# Altium integrated library LED-THP_V2.IntLib: 218 symbols (continued)
## LED-Clear-3mm-Diffused
designator LD?  value Clear-DF  Text1: 3mm  (hidden comment: LED-Clear-3mm-Diffused)
LED Clear 3mm - Diffused; Manufacturer: Various; Part Number: LED Clear 3mm - Diffused; Package: LED-3mm-Clear; EDM-PN: *; SAAB PN: *
footprint LED-3mm-Clear (LED 3mm 4.0x4.0mm Clear)
pins: 1 K, 2 A

## LED-Clear-3mm-Rt
designator LD?  value Clear  Text1: 3mm  (hidden comment: LED-Clear-3mm-Rt)
LED Clear 3mm Rt Angle; Manufacturer: Various; Part Number: LED Clear 3mm; Package: LED-3mm-Clear-Rt; EDM-PN: *; SAAB PN: *
footprint LED-3mm-Clear-Rt (LED 3mm R Angle 4.0x4.0mm Clear)
pins: 1 K, 2 A

## LED-Clear-5mm
designator LD?  value Clear  Text1: 5mm  (hidden comment: LED-Clear-5mm)
LED Clear 5mm; Manufacturer: Various; Part Number: LED Clear 5mm; Package: LED-5mm-Clear; EDM-PN: *; SAAB PN: *
footprint LED-5mm-Clear (LED 5mm 5.9x5.5mm)
pins: 1 K, 2 A

## LED-Clear-5mm-Diffused
designator LD?  value Clear-DF  Text1: 5mm  (hidden comment: LED-Clear-5mm-Diffused)
LED Clear 5mm - Diffused; Manufacturer: Various; Part Number: LED Clear 5mm - Diffused; Package: LED-5mm-Clear; EDM-PN: *; SAAB PN: *
footprint LED-5mm-Clear (LED 5mm 5.9x5.5mm)
pins: 1 K, 2 A

## LED-Clear-5mm-FLAT
designator LD?, comment value Clear  Text1: 5mm  (hidden comment: LED-Clear-5mm)
LED Clear 5mm (Mounted Flat); Manufacturer: Various; Part Number: LED Clear 5mm; Package: LED-5mm-Clear-FLAT; EDM-PN: *; SAAB PN: *
footprint LED-5mm-Clear-Flat (LED 5mm 5.9x5.5mm)
pins: 1 K, 2 A

## LED-Green-3mm
designator LD?  value Green  Text1: 3mm  (hidden comment: LED-Green-3mm)
LED Green 3mm; Manufacturer: Various; EDM-PN: LED21; Reutech PN: 5961-LE-0024; Part Number: LED Green 3mm; Package: LED-3mm-Green; SAAB PN: *
footprint LED-3mm-Green (LED 3mm 4.0x4.0mm Green)
pins: 1 K, 2 A

## LED-Green-3mm-4mm
designator LD?, comment value Green  Text1: 3mm  (hidden comment: LED-Green-3mm)
LED Green 3mm - 4mm Space; Manufacturer: Various; EDM-PN: LED21; Reutech PN: 5961-LE-0024; Part Number: LED Green 3mm; Package: LED-3mm-Green-4; SAAB PN: *
footprint LED-3mm-Green-4mm (LED 3mm 4.0x4.0mm Green)
pins: 1 K, 2 A

## LED-Green-3mm-9mm
designator LD?  value Green  Text1: 3mm  (hidden comment: LED-Green-3mm-9mm)
LED Green 3mm; Manufacturer: Various; EDM-PN: LED21; Reutech PN: 5961-LE-0024; Part Number: LED Green 3mm; Package: LED-3mm-Green-9mm; SAAB PN: *
footprint LED-3mm-Green-9MM (LED 3mm 4.0x4.0mm Green)
pins: 1 K, 2 A

## LED-Green-3mm-22mm
designator LD?  value Green  Text1: 3mm  (hidden comment: LED-Green-3mm-22mm)
LED Green 3mm (22mm High); Manufacturer: Various; EDM-PN: LED21; Part Number: LED Green 3mm; Package: LED-3mm-Green-22mm; SAAB PN: *
footprint LED-3mm-Green-22mm (LED 3mm 4.0x4.0mm Green)
pins: 1 K, 2 A

## LED-Green-3mm-7376
designator LD?  value Green  Text1: 3mm  (hidden comment: LED-Green-3mm-7376)
LED Green 3mm and Spacer; Manufacturer: Various/Keystone; Part Number: LED Green 3mm/7376; EDM-PN: LED21; Package: LED-3mm-Green-7376; Reutech PN: *; SAAB PN: *
footprint LED-3mm-Green-7376 (LED 3mm 4.0x4.0mm Green)
pins: 1 K, 2 A

## LED-Green-3mm-151031VS04000
designator LD?, comment value Green  Text1: 3mm  (hidden comment: 151031VS04000)
LED Green 3mm - Diffused; Manufacturer: Wurth; Part Number: 151031VS04000; Package: LED-3mm-Green; EDM-PN: *; Reutech PN: *; SAAB PN: *
footprint LED-3mm-Green (LED 3mm 4.0x4.0mm Green)
pins: 1 K, 2 A

## LED-Green-3mm-Diffused
designator LD?  value Green-DF  Text1: 3mm  (hidden comment: LED-Green-3mm-Diffused)
LED Green 3mm - Diffused; Manufacturer: Various; Part Number: LED Green 3mm - Diffused; Package: LED-3mm-Green; EDM-PN: *; SAAB PN: *
footprint LED-3mm-Green (LED 3mm 4.0x4.0mm Green)
pins: 1 K, 2 A

## LED-Green-3mm-HLMP-1521
designator LD?, comment value Green  Text1: 3mm  (hidden comment: HLMP-1521)
LED Green 3mm 10mA; Manufacturer: Broadcom; Part Number: HLMP-1521; Package: LED-3mm-Green; EDM-PN: *; Reutech PN: *; SAAB PN: *
footprint LED-3mm-Green (LED 3mm 4.0x4.0mm Green)
pins: 1 K, 2 A

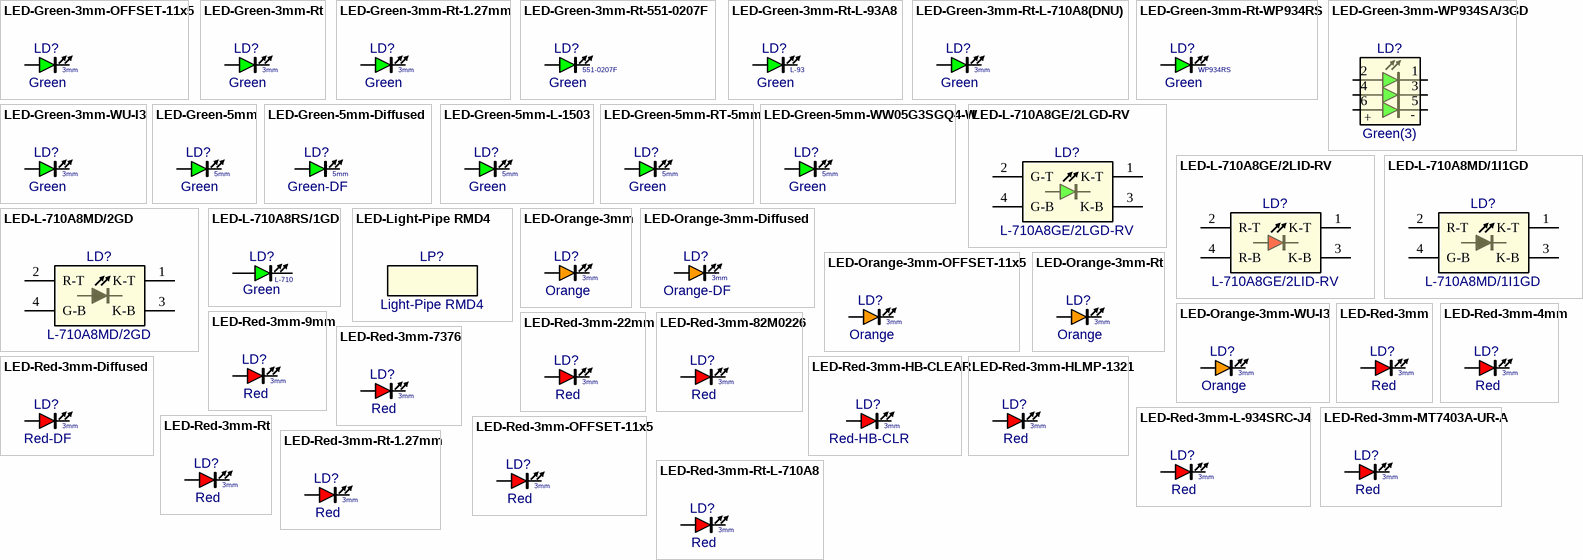
[diagram p3: symbols LED-Green-3mm-OFFSET-11x5 to LED-Red-3mm-Rt-L-710A8]

## LED-Green-3mm-OFFSET-11x5
designator LD?, comment value Green  Text1: 3mm  (hidden comment: LED-Green-3mm)
LED Green 3mm; Manufacturer: Various; Reutech PN: 5961-LE-0024; Part Number: LED Green 3mm; Package: LED-3mm-Green-5MM-OFFSET; EDM-PN: *; SAAB PN: *
footprint LED-3mm-Green-5MM-OFFSET (LED 3mm 4.0x4.0mm Green)
pins: 1 K, 2 A

## LED-Green-3mm-Rt
designator LD?  value Green  Text1: 3mm  (hidden comment: LED-Green-3mm-Rt)
LED Green 3mm Rt Angle; Manufacturer: Various; EDM-PN: LED21; Reutech PN: 5961-LE-0024; Part Number: LED Green 3mm; Package: LED-3mm-Green-Rt; SAAB PN: *
footprint LED-3mm-Green-Rt (LED 3mm R Angle 4.0x4.0mm Green)
pins: 1 K, 2 A

## LED-Green-3mm-Rt-1.27mm
designator LD?  value Green  Text1: 3mm  (hidden comment: LED-Green-3mm-Rt-1.27mm)
LED Green 3mm Rt Angle; Manufacturer: Various; EDM-PN: LED21; Part Number: LED Green 3mm; Package: LED-3mm-Green-Rt-1.27mm; Reutech PN: *; SAAB PN: *
footprint LED-3mm-Green-Rt-1.27mm (LED 3mm Rt Angle 4.0x4.0mm Green)
pins: 1 K, 2 A

## LED-Green-3mm-Rt-551-0207F
designator LD?, comment value Green  (hidden comment: 551-0207F)
LED Green 3mm Rt Angle; Manufacturer: Dialight; EDM-PN: LED79; Part Number: 551-0207F; Package: LED-3mm-L-93A8-Green; SAAB PN: *; Text1: 551-0207F
footprint LED-3mm-Green-551-0207F (LED-3mm-L551-0207F-Green 6.35x4.6mm)
pins: 1 K, 2 A

## LED-Green-3mm-Rt-L-93A8
designator LD?  value Green  Text1: L-93  (hidden comment: LED-Green-3mm-Rt-L-93A8)
LED Green 3mm Rt Angle; Manufacturer: Kingbright; Part Number: L-93A8CB/1GD; Package: LED-3mm-L-93A8-Green; EDM-PN: *; SAAB PN: *
footprint LED-3mm-L-93A8-Green (LED-3mm-L-93A8-Green 6.35x4.6mm)
pins: 1 K, 2 A

## LED-Green-3mm-Rt-L-710A8(DNU)
designator LD?, comment value Green  Text1: 3mm  (hidden comment: LED-Green-3mm-Rt-L-710A8)
LED Green 3mm Rt Angle; Manufacturer: Kingbright; Part Number: L-710A8RS/1GD; Package: LED-3mm-L-710-Green; EDM-PN: *; SAAB PN: *
footprint LED-3mm-L-710-Green (LED-3mm-L-710-Green 6.35x4.32mm)
pins: 1 K, 2 A

## LED-Green-3mm-Rt-WP934RS
designator LD?  value Green  Text1: WP934RS  (hidden comment: LED-Green-3mm-Rt-WP934RS)
LED Green 3mm Rt Angle; Manufacturer: Kingbright; Part Number: WP934RS/GD; Package: LED-3mm-WP934RS-Green; EDM-PN: *; SAAB PN: *
footprint LED-3mm-L-934RS-Green (LED-3mm-L-934RS-Green 4.6x4.6mm)
pins: 1 K, 2 A

## LED-Green-3mm-WP934SA/3GD
designator LD?  value Green(3)  (hidden comment: LED-Green-3mm-WP934SA/3GD)
LED Green 3mm tri-Level; Manufacturer: Kingbright; Part Number: WP934SA/3GD; Package: LED-3mm-Green; EDM-PN: *; Text1: *; SAAB PN: *
footprint T-1(3mm)TRI-LEVEL-Green (T-1(3mm)TRI-LEVEL  Green 11.43x4.32mm)
pins: 1 K1, 2 A1, 3 K2, 4 A2, 5 K3, 6 A3
text: +; -

## LED-Green-3mm-WU-I3
designator LD?  value Green  Text1: 3mm  (hidden comment: LED-Green-3mm-WU-I3)
LED Green 3mm and WU-I3 Holder; Manufacturer: Various/Commuica; Part Number: LED Green 3mm/WU-I3; Package: LED-3mm-Green-WU-I3; EDM-PN: *; SAAB PN: *
footprint LED-3mm-GREEN-WU-I3 (LED 3mm WU-I3 8.0x8.0mm Green)
pins: 1 K, 2 A

## LED-Green-5mm
designator LD?  value Green  Text1: 5mm  (hidden comment: LED-Green-5mm)
LED Green 5mm; Manufacturer: Various; Part Number: LED Green 5mm; Package: LED-5mm-Green; EDM-PN: *; SAAB PN: *
footprint LED-5mm-Green (LED 5mm 5.9x5.5mm)
pins: 1 K, 2 A

## LED-Green-5mm-Diffused
designator LD?  value Green-DF  Text1: 5mm  (hidden comment: LED-Green-5mm-Diffused)
LED Green 5mm - Diffused; Manufacturer: Various; Part Number: LED Green 5mm - Diffused; Package: LED-5mm-Green; EDM-PN: *; SAAB PN: *
footprint LED-5mm-Green (LED 5mm 5.9x5.5mm)
pins: 1 K, 2 A

## LED-Green-5mm-L-1503
designator LD?, comment value Green  Text1: 5mm  (hidden comment: LED-Green-SB-5mm-L1503)
LED Green 5mm Rt Angle; Manufacturer: Kingbright; Part Number: L-1503CB/1GD; Package: LED-5MM-GREEN-RT-9.2x6; EDM-PN: *; SAAB PN: *
footprint LED-5MM-GREEN-RT-9.2x6 (LED-5mm RT 9.2x6.0mm Green)
pins: 1 K, 2 A

## LED-Green-5mm-RT-5mm
designator LD?, comment value Green  Text1: 5mm  (hidden comment: LED-Green-5mm)
LED Green 5mm; Manufacturer: Various; Part Number: LED Green 5mm; Package: LED-5mm-Green-RT-5mm; EDM-PN: *; SAAB PN: *
footprint LED-5mm-Green-RT-5mm (LED 5mm 5.9x5.5mm)
pins: 1 K, 2 A

## LED-Green-5mm-WW05G3SGQ4-W
designator LD?, comment value Green  Text1: 5mm  (hidden comment: WW05G3SGQ4-W)
LED Green 5mm 4.7mm High; Manufacturer: WAH WANG Holdings/Rabtron; EDM-PN: LED190; Part Number: WW05G3SGQ4-W; Package: LED-5x4.7mm-Green; SAAB PN: *
footprint LED-5x4.7mm-GREEN (LED 5mm 5.9x5.5mm 4.7mm Green)
pins: 1 K, 2 A

## LED-L-710A8GE/2LGD-RV
designator LD?, comment value L-710A8GE/2LGD-RV  (hidden comment: LED3mm-Dual-L-710A8GE/2LGD-RV)
LED Dual 3mm T-1 Rt Angle Green/Green; Manufacturer: Kingbright; Part Number: L-710A8GE/2LGD-RV; Package: LED-3mm-L-710-D-Green; EDM-PN: *; SAAB PN: *
footprint LED-3mm-L-710-D-Green (LED 3mm 10.54x4.3mm Dual Rt Angle)
pins: 1 K-T, 2 G-T, 3 K-B, 4 G-B

## LED-L-710A8GE/2LID-RV
designator LD?, comment value L-710A8GE/2LID-RV  (hidden comment: LED3mm-Dual-L-710A8GE/2LID-RV)
LED Dual 3mm T-1 Rt Angle Red/Red; Manufacturer: Kingbright; Part Number: L-710A8GE/2LID-RV; Package: LED-3mm-L-710-D-red; EDM-PN: *; SAAB PN: *
footprint LED-3mm-L-710-D-Red (LED 3mm 10.54x4.3mm Dual Rt Angle)
pins: 1 K-T, 2 R-T, 3 K-B, 4 R-B

## LED-L-710A8MD/1I1GD
designator LD?, comment value L-710A8MD/1I1GD  (hidden comment: LED3mm-Dual-L-710A8MD/1I1GD)
LED Dual 3mm T-1 Rt Angle Red/Green; Manufacturer: Kingbright; Part Number: L-710A8MD/1I1GD; Package: LED-3mm-Dual-Rt-R/G; EDM-PN: *; SAAB PN: *
footprint LED-3mm-Dual-Rt-R/G (LED 3mm 8.13x4.3mm Dual Rt Angle)
pins: 1 K-T, 2 R-T, 3 K-B, 4 G-B

## LED-L-710A8MD/2GD
designator LD?, comment L-710A8MD/2GD
LED Dual 3mm T-1 Rt Angle Green/Green; Manufacturer: Kingbright; Part Number: L-710A8MD/2GD; Package: LED-3mm-Dual-Rt-G/G; EDM-PN: *; SAAB PN: *; Value: L-710A8MD/2GD
footprint LED-3mm-Dual-Rt-G/G (LED 3mm 8.13x4.3mm Dual Rt Angle)
pins: 1 K-T, 2 R-T, 3 K-B, 4 G-B

## LED-L-710A8RS/1GD
designator LD?  value Green  Text1: L-710  (hidden comment: LED-L-710A8RS/1GD)
LED Green 3mm Rt Angle; Manufacturer: Kingbright; Package: LED-3mm-L-710-Green; EDM-PN: *; SAAB PN: *; Part Number: L-710A8RS/1GD
footprint LED-3mm-L-710-Green (LED-3mm-L-710-Green 6.35x4.32mm)
pins: 1 K, 2 G

## LED-Light-Pipe RMD4
designator LP?  value Light-Pipe RMD4  (hidden comment: LED-Light-Pipe RMD4)
LED Light Pipe; Manufacturer: Owner; Part Number: Light-Pipe RMD4; Package: Light-Pipe-RMD4; EDM-PN: *; SAAB PN: *
footprint Light-Pipe-RMD4

## LED-Orange-3mm
designator LD?  value Orange  Text1: 3mm  (hidden comment: LED-Orange-3mm)
LED Orange 3mm; Manufacturer: Various; Part Number: LED Orange 3mm; Package: LED-3mm-Orange; EDM-PN: *; SAAB PN: *
footprint LED-3mm-Orange (LED 3mm 4.0x4.0mm Orange)
pins: 1 K, 2 A

## LED-Orange-3mm-Diffused
designator LD?  value Orange-DF  Text1: 3mm  (hidden comment: LED-Orange-3mm-Diffused)
LED Orange 3mm - Diffused; Manufacturer: Various; Part Number: LED Orange 3mm - Diffused; Package: LED-3mm-Orange; EDM-PN: *; SAAB PN: *
footprint LED-3mm-Orange (LED 3mm 4.0x4.0mm Orange)
pins: 1 K, 2 A

## LED-Orange-3mm-OFFSET-11x5
designator LD?, comment value Orange  Text1: 3mm  (hidden comment: LED-Orange-3mm)
LED Orange 3mm; Manufacturer: Various; Part Number: LED Orange 3mm; Package: LED-3mm-Orange-5MM-OFFSET; EDM-PN: *; SAAB PN: *
footprint LED-3mm-ORANGE-5MM-OFFSET (LED 3mm 4.0x4.0mm ORANGE)
pins: 1 K, 2 A

## LED-Orange-3mm-Rt
designator LD?  value Orange  Text1: 3mm  (hidden comment: LED-Orange-3mm-Rt)
LED Orange 3mm Rt Angle; Manufacturer: Various; Part Number: LED Orange 3mm; Package: LED-3mm-Orange-Rt; EDM-PN: *; SAAB PN: *
footprint LED-3mm-Orange-Rt (LED 3mm R Angle 4.0x4.0mm Orange)
pins: 1 K, 2 A

## LED-Orange-3mm-WU-I3
designator LD?  value Orange  Text1: 3mm  (hidden comment: LED-Orange-3mm-WU-I3)
LED Orange 3mm and WU-I3 Holder; Manufacturer: Various/Commuica; Part Number: LED Orange 3mm/WU-I3; Package: LED-3mm-Orange-WU-I3; EDM-PN: *; SAAB PN: *
footprint LED-3mm-ORANGE-WU-I3 (LED 3mm WU-I3 8.0x8.0mm Orange)
pins: 1 K, 2 A

## LED-Red-3mm
designator LD?  value Red  Text1: 3mm  (hidden comment: LED-Red-3mm)
LED Red 3mm; Manufacturer: Various; EDM-PN: LED94; Reutech PN: 5961-LE-0073; Part Number: LED Red 3mm; Package: LED-3mm-Red; SAAB PN: *
footprint LED-3mm-Red (LED 3mm 4.0x4.0mm Red)
pins: 1 K, 2 A

## LED-Red-3mm-4mm
designator LD?, comment value Red  Text1: 3mm  (hidden comment: LED-Red-3mm)
LED Red 3mm - 4mm Space; Manufacturer: Various; EDM-PN: LED94; Reutech PN: 5961-LE-0073; Part Number: LED Red 3mm; Package: LED-3mm-Red-4mm; SAAB PN: *
footprint LED-3mm-Red-4mm (LED 3mm 4.0x4.0mm Red)
pins: 1 K, 2 A

## LED-Red-3mm-9mm
designator LD?  value Red  Text1: 3mm  (hidden comment: LED-Red-3mm-9mm)
LED Red 3mm; Manufacturer: Various; EDM-PN: LED94; Reutech PN: 5961-LE-0073; Part Number: LED Red 3mm; Package: LED-3mm-Red-9mm; SAAB PN: *
footprint LED-3mm-Red-9MM (LED 3mm 4.0x4.0mm Red)
pins: 1 K, 2 A

## LED-Red-3mm-22mm
designator LD?  value Red  Text1: 3mm  (hidden comment: LED-Red-3mm-22mm)
LED Red 3mm (22mm High); Manufacturer: Various; EDM-PN: LED94; Part Number: LED Red 3mm; Package: LED-3mm-Red-22mm; SAAB PN: *
footprint LED-3mm-Red-22mm (LED 3mm 4.0x4.0mm Red)
pins: 1 K, 2 A

## LED-Red-3mm-82M0226
designator LD?  value Red  Text1: 3mm  (hidden comment: LED-Red-3mm-82M0226)
LED Red 3mm and 82M0226; Manufacturer: Various/Mantech; Part Number: LED Red 3mm/82M0226; Package: LED-3mm-Red-82M0226; EDM-PN: *; SAAB PN: *
footprint LED-3mm-Red (LED 3mm 4.0x4.0mm Red)
pins: 1 K, 2 A

## LED-Red-3mm-7376
designator LD?  value Red  Text1: 3mm  (hidden comment: LED-Red-3mm-7376)
LED Red 3mm and Spacer; Manufacturer: Various/Keystone; Part Number: LED Red 3mm/7376; Package: LED-3mm-Red-7376; EDM-PN: *; Reutech PN: *; SAAB PN: *
footprint LED-3mm-Red-7376 (LED 3mm 4.0x4.0mm Red)
pins: 1 K, 2 A

## LED-Red-3mm-Diffused
designator LD?  value Red-DF  Text1: 3mm  (hidden comment: LED-Red-3mm-Diffused)
LED Red 3mm - Diffused; Manufacturer: Various; Part Number: LED Red 3mm - Diffused; Package: LED-3mm-Red; EDM-PN: *; SAAB PN: *
footprint LED-3mm-Red (LED 3mm 4.0x4.0mm Red)
pins: 1 K, 2 A

## LED-Red-3mm-HB-CLEAR
designator LD?, comment value Red-HB-CLR  Text1: 3mm  (hidden comment: LED-Red-3mm-HB-CLR)
LED Red 3mm High-Bright Clear; Manufacturer: Various; Part Number: LED Red 3mm High-bright Clear; Package: LED-3mm-Red; EDM-PN: *; SAAB PN: *
footprint LED-3mm-Red (LED 3mm 4.0x4.0mm Red)
pins: 1 K, 2 A

## LED-Red-3mm-HLMP-1321
designator LD?, comment value Red  Text1: 3mm  (hidden comment: HLMP-1321)
LED Red 3mm 10mA; Manufacturer: Broadcom; Part Number: HLMP-1321; Package: LED-3mm-Red; EDM-PN: *; Reutech PN: *; SAAB PN: *
footprint LED-3mm-Red (LED 3mm 4.0x4.0mm Red)
pins: 1 K, 2 A

## LED-Red-3mm-L-934SRC-J4
designator LD?, comment value Red  Text1: 3mm  (hidden comment: L-934SRC-J4)
LED Red 3mm Super Bright; Manufacturer: Kingbright; Part Number: L-934SRC-J4; Package: LED-3mm-Red; EDM-PN: *; Reutech PN: *; SAAB PN: *
footprint LED-3mm-Red (LED 3mm 4.0x4.0mm Red)
pins: 1 K, 2 A

## LED-Red-3mm-MT7403A-UR-A
designator LD?, comment value Red  Text1: 3mm  (hidden comment: MT7403A-UR-A)
LED Red 3mm; Manufacturer: Marktech Optoelectronics; Part Number: MT7403A-UR-A; Package: LED-3mm-Red; EDM-PN: *; Reutech PN: *; SAAB PN: *
footprint LED-3mm-Red (LED 3mm 4.0x4.0mm Red)
pins: 1 K, 2 A

## LED-Red-3mm-OFFSET-11x5
designator LD?, comment value Red  Text1: 3mm  (hidden comment: LED-Red-3mm)
LED Red 3mm; Manufacturer: Various; Reutech PN: 5961-LE-0073; Part Number: LED Red 3mm; Package: LED-3mm-Red-5MM-OFFSET; EDM-PN: *; SAAB PN: *
footprint LED-3mm-RED-5MM-OFFSET (LED 3mm 4.0x4.0mm RED)
pins: 1 K, 2 A

## LED-Red-3mm-Rt
designator LD?  value Red  Text1: 3mm  (hidden comment: LED-Red-3mm-Rt)
LED Red 3mm Rt Angle; Manufacturer: Various; EDM-PN: LED94; Reutech PN: 5961-LE-0073; Part Number: LED Red 3mm; Package: LED-3mm-Red-Rt; SAAB PN: *
footprint LED-3mm-Red-Rt (LED 3mm R Angle 4.0x4.0mm Red)
pins: 1 K, 2 A

## LED-Red-3mm-Rt-1.27mm
designator LD?  value Red  Text1: 3mm  (hidden comment: LED-Red-3mm-Rt-1.27mm)
LED Red 3mm Rt Angle; Manufacturer: Various; EDM-PN: LED94; Reutech PN: 5961-LE-0073; Part Number: LED Red 3mm; Package: LED-3mm-Red-Rt-1.27mm; SAAB PN: *
footprint LED-3mm-Red-Rt-1.27mm (LED 3mm R Angle 4.0x4.0mm Red)
pins: 1 K, 2 A

## LED-Red-3mm-Rt-L-710A8
designator LD?  value Red  Text1: 3mm  (hidden comment: LED-Red-3mm-Rt-L-710A8)
LED Red 3mm Rt Angle; Manufacturer: Kingbright; Part Number: L-710A8EW/1ID; Package: LED-3mm-L-710-Red; EDM-PN: *; SAAB PN: *
footprint LED-3mm-L-710-Red (LED-3mm-L-710-Red 6.35x4.32mm)
pins: 1 K, 2 A

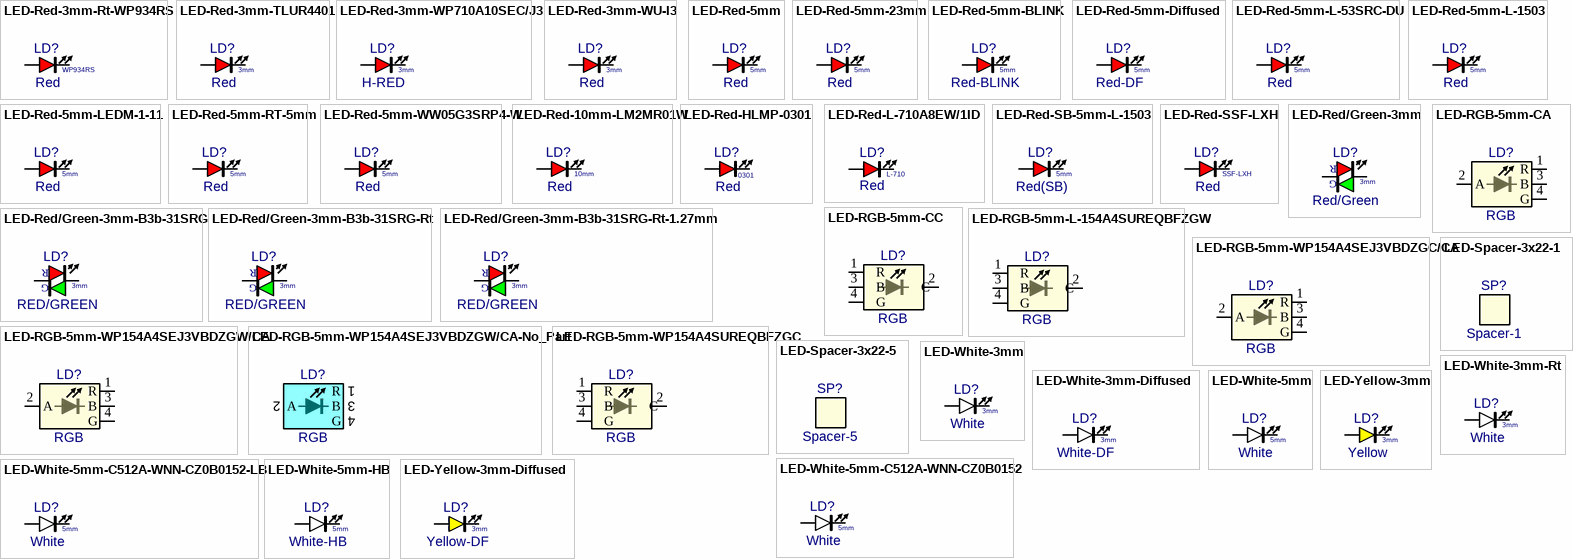
[diagram p4: symbols LED-Red-3mm-Rt-WP934RS to LED-Yellow-3mm-Diffused]

## LED-Red-3mm-Rt-WP934RS
designator LD?  value Red  Text1: WP934RS  (hidden comment: LED-Red-3mm-Rt-WP934RS)
LED Red 3mm Rt Angle; Manufacturer: Kingbright; Part Number: WP934RS/ID; Package: LED-3mm-WP934RS-Red; EDM-PN: *; SAAB PN: *
footprint LED-3mm-L-934RS-Red (LED-3mm-L-934RS-Red 4.6x4.6mm)
pins: 1 K, 2 A

## LED-Red-3mm-TLUR4401
designator LD?  value Red  Text1: 3mm  (hidden comment: LED-Red-3mm-TLUR4401)
LED Red 3mm; Manufacturer: Vishay; Part Number: TLUR4401; Package: LED-3mm-Red; EDM-PN: *; SAAB PN: *
footprint LED-3mm-Red (LED 3mm 4.0x4.0mm Red)
pins: 1 K, 2 A

## LED-Red-3mm-WP710A10SEC/J3
designator LD?, comment value H-RED  Text1: 3mm  (hidden comment: WP710A10SEC/J3)
LED Hyper Red 3mm; Manufacturer: Kingbright; Part Number: WP710A10SEC/J3; Package: LED-3mm-Red; EDM-PN: *; Reutech PN: *; SAAB PN: *
footprint LED-3mm-Red (LED 3mm 4.0x4.0mm Red)
pins: 1 K, 2 A

## LED-Red-3mm-WU-I3
designator LD?  value Red  Text1: 3mm  (hidden comment: LED-Red-3mm-WU-I3)
LED Red 3mm and WU-I3 Holder; Manufacturer: Various/Commuica; Part Number: LED Red 3mm/WU-I3; Package: LED-3mm-Red-WU-I3; EDM-PN: *; SAAB PN: *
footprint LED-3mm-RED-WU-I3 (LED 3mm WU-I3 8.0x8.0mm Red)
pins: 1 K, 2 A

## LED-Red-5mm
designator LD?  value Red  Text1: 5mm  (hidden comment: LED-Red-5mm)
LED Red 5mm; Manufacturer: Various; Part Number: LED Red 5mm; Package: LED-5mm-Red; EDM-PN: *; SAAB PN: *
footprint LED-5mm-Red (LED 5mm 5.9x5.5mm)
pins: 1 K, 2 A

## LED-Red-5mm-23mm
designator LD?  value Red  Text1: 5mm  (hidden comment: LED-Red-5mm-23mm)
LED Red 5mm; Manufacturer: Various; Part Number: LED Red 5mm; Package: LED-5mm-Red-23mm; EDM-PN: *; SAAB PN: *
footprint LED-5mm-Red-23mm (LED 5mm 5.9x5.5mm)
pins: 1 K, 2 A

## LED-Red-5mm-BLINK
designator LD?, comment value Red-BLINK  Text1: 5mm  (hidden comment: LED-Red-5mm-Blink)
LED Red 5mm Flashing 3-10VDC; Manufacturer: Bright Led; Part Number: BB-B5174; Package: LED-5mm-Red; EDM-PN: *; SAAB PN: *
footprint LED-5mm-Red (LED 5mm 5.9x5.5mm)
pins: 1 K, 2 A

## LED-Red-5mm-Diffused
designator LD?  value Red-DF  Text1: 5mm  (hidden comment: LED-Red-5mm-Diffused)
LED Red 5mm - Diffused; Manufacturer: Various; Part Number: LED Red 5mm - Diffused; Package: LED-5mm-Red; EDM-PN: *; SAAB PN: *
footprint LED-5mm-Red (LED 5mm 5.9x5.5mm)
pins: 1 K, 2 A

## LED-Red-5mm-L-53SRC-DU
designator LD?, comment value Red  Text1: 5mm  (hidden comment: L-53SRC-DU)
LED Red Super Bright 5mm; Manufacturer: Kingbright; Part Number: L-53SRC-DU; Package: LED-5mm-Red; EDM-PN: *; SAAB PN: *
footprint LED-5mm-Red (LED 5mm 5.9x5.5mm)
pins: 1 K, 2 A

## LED-Red-5mm-L-1503
designator LD?, comment value Red  Text1: 5mm  (hidden comment: LED-Red-5mm-L1503)
LED Red 5mm Rt Angle; Manufacturer: Kingbright; Part Number: L-1503CB/1ID; Package: LED-5MM-RED-RT-9.2x6; EDM-PN: *; SAAB PN: *
footprint LED-5MM-RED-RT-9.2x6 (LED-5mm RT 9.2x6.0mm Red)
pins: 1 K, 2 A

## LED-Red-5mm-LEDM-1-11
designator LD?  value Red  Text1: 5mm  (hidden comment: LED-Red-5mm-LEDM-1-11)
LED Red 5mm and 11mm Spacer; Manufacturer: Various/Essentra; Part Number: LED Red 5mm/LEDM-1-11; Package: LED-5mm-Red-LEDM-1-11; EDM-PN: *; SAAB PN: *
footprint LED-5mm-Red-LEDM-1-11 (LED 5mm 5.9x5.5mm)
pins: 1 K, 2 A

## LED-Red-5mm-RT-5mm
designator LD?, comment value Red  Text1: 5mm  (hidden comment: LED-Red-5mm)
LED Red 5mm; Manufacturer: Various; Part Number: LED Red 5mm; Package: LED-5mm-Red-RT-5mm; EDM-PN: *; SAAB PN: *
footprint LED-5mm-Red-RT-5mm (LED 5mm 5.9x5.5mm)
pins: 1 K, 2 A

## LED-Red-5mm-WW05G3SRP4-W
designator LD?, comment value Red  Text1: 5mm  (hidden comment: WW05G3SRP4-W)
LED Red 5mm 4.7mm High; Manufacturer: WAH WANG Holdings/Rabtron; EDM-PN: LED191; Part Number: WW05G3SRP4-W; Package: LED-5x4.7mm-RED; SAAB PN: *
footprint LED-5x4.7mm-RED (LED 5mm 5.9x5.5mm 4.7mm Red)
pins: 1 K, 2 A

## LED-Red-10mm-LM2MR01W
designator LD?, comment value Red  Text1: 10mm  (hidden comment: LM2MR01W)
LED Red 10mm; Manufacturer: SunLed; Part Number: LM2MR01W; Package: LED-10mm-Red; EDM-PN: *; SAAB PN: *
footprint LED-10mm-Red (LED 10mm Red 11.0x11.0mm)
pins: 1 K, 2 A

## LED-Red-HLMP-0301
designator LD?, comment value Red  Text1: 0301  (hidden comment: LED-Red-HLMP-0301-H)
LED Red Rectangle; Manufacturer: Avago; Reutech PN: 5961-EA-0059; Part Number: HLMP-0301; Package: LED-REC-2.5x7.6; EDM-PN: *; SAAB PN: *
footprint LED-REC-2.5x7.6 (LED Rectangular 2.5x7.6mm)
pins: 1 K, 2 A

## LED-Red-L-710A8EW/1ID
designator LD?, comment value Red  Text1: L-710  (hidden comment: LED-L-710A8EW/1ID_H)
LED Red 3mm Rt Angle; Manufacturer: Kingbright; Package: LED-3mm-L-710-Red; EDM-PN: *; SAAB PN: *; Part Number: L-710A8EW/1ID
footprint LED-3mm-L-710-Red (LED-3mm-L-710-Red 6.35x4.32mm)
pins: 1 K, 2 R

## LED-Red-SB-5mm-L-1503
designator LD?, comment value Red(SB)  Text1: 5mm  (hidden comment: LED-Red-SB-5mm-L1503)
LED Red SB 5mm Rt Angle; Manufacturer: Kingbright; Part Number: L-1503CB/1SRD; Package: LED-5MM-RED-SB-RT-9.2x6; EDM-PN: *; SAAB PN: *
footprint LED-5MM-RED-SB-RT-9.2x6 (LED-5mm RT 9.2x6.0mm Red SB)
pins: 1 K, 2 A

## LED-Red-SSF-LXH
designator LD?  value Red  Text1: SSF-LXH  (hidden comment: LED-Red-SSF-LXH)
LED Red 5mm Holder; Manufacturer: Lumex; Part Number: SSF-LXH100MSRD; Reutech PN: 5961-EA-0107; Package: LED-5mm-Rt-SSF; EDM-PN: *; SAAB PN: *
footprint LED-5mm-Rt-SSF (LED 5mm 6.35x8.9mm Rt Angle)
pins: 1 K, 2 A

## LED-Red/Green-3mm
designator LD?  value Red/Green  Text1: 3mm  (hidden comment: LED-Red/Green-3mm)
LED Red/Green 3mm 2 Pin; Manufacturer: Kingbright; Part Number: WP937EGQ; Package: LED-3mm-Red/Green; EDM-PN: *; SAAB PN: *
footprint LED-3mm-Red/Green (LED 3mm 4.0x4.0mm Red)
pins: 1 K, 2 A
text: R; G

## LED-Red/Green-3mm-B3b-31SRG
designator LD?  value RED/GREEN  Text1: 3mm  (hidden comment: LED-Red/Green-3mm-B3b-31SRG)
LED Red/Green 3mm 2 Pin; Manufacturer: Diana; Part Number: B3b-31SRG; Package: LED-3mm-Red/Green; EDM-PN: *; Reutech PN: *; SAAB PN: *
footprint LED-3mm-Red/Green (LED 3mm 4.0x4.0mm Red)
pins: 1 K, 2 A
text: R; G

## LED-Red/Green-3mm-B3b-31SRG-Rt
designator LD?, comment value RED/GREEN  Text1: 3mm  (hidden comment: LED-Red/Green-3mm-B3b-31SRG)
LED Red/Green 3mm 2 Pin; Manufacturer: Diana; Part Number: B3b-31SRG; Package: LED-3mm-Red/Green-Rt; EDM-PN: *; Reutech PN: *; SAAB PN: *
footprint LED-3mm-Red/Green-Rt (LED 3mm R Angle 4.0x4.0mm Red green)
pins: 1 K, 2 A
text: R; G

## LED-Red/Green-3mm-B3b-31SRG-Rt-1.27mm
designator LD?, comment value RED/GREEN  Text1: 3mm  (hidden comment: LED-Red/Green-3mm-B3b-31SRG)
LED Red/Green 3mm 2 Pin; Manufacturer: Diana; Part Number: B3b-31SRG; Package: LED-3mm-Red/Green-Rt-1.27mm; EDM-PN: *; Reutech PN: *; SAAB PN: *
footprint LED-3mm-Red/Green-Rt-1.27mm (LED 3mm R Angle 4.0x4.0mm Red)
pins: 1 K, 2 A
text: R; G

## LED-RGB-5mm-CA
designator LD?, comment value RGB  (hidden comment: LED-RGB-5mm)
LED RGB 5mm Common Anode; Manufacturer: Various; Part Number: LED RGB 5mm CA; Package: LED-5mm-RGB; EDM-PN: *; SAAB PN: *
footprint LED-5mm-RGB (LED 5mm 5.9x5.5mm)
pins: 1 R, 2 A, 3 B, 4 G

## LED-RGB-5mm-CC
designator LD?  value RGB  (hidden comment: LED-RGB-5mm-CC)
LED RGB 5mm Common Cathode; Manufacturer: Various; Part Number: LED-RGB-5mm-CC; Package: LED-5mm-RGB; EDM-PN: *; SAAB PN: *
footprint LED-5mm-RGB (LED 5mm 5.9x5.5mm)
pins: 1 R, 2 C, 3 B, 4 G

## LED-RGB-5mm-L-154A4SUREQBFZGW
designator LD?, comment value RGB  (hidden comment: L-154A4SUREQBFZGW)
LED RGB 5mm Common Cathode; Manufacturer: Kingbright; Part Number: L-154A4SUREQBFZGW; Package: LED-5mm-RGB; EDM-PN: *; SAAB PN: *
footprint LED-5mm-RGB (LED 5mm 5.9x5.5mm)
pins: 1 R, 2 C, 3 B, 4 G

## LED-RGB-5mm-WP154A4SEJ3VBDZGC/CA
designator LD?, comment value RGB  (hidden comment: WP154A4SEJ3VBDZGC/CA)
LED RGB 5mm Common Anode; Manufacturer: Kingbright; EDM-PN: LED186; Part Number: WP154A4SEJ3VBDZGC/CA; Package: LED-5mm-RGB; SAAB PN: *
footprint LED-5mm-RGB (LED 5mm 5.9x5.5mm)
pins: 1 R, 2 A, 3 B, 4 G

## LED-RGB-5mm-WP154A4SEJ3VBDZGW/CA
designator LD?, comment value RGB  (hidden comment: WP154A4SEJ3VBDZGW/CA)
LED RGB 5mm Common Anode; Manufacturer: Kingbright; Part Number: WP154A4SEJ3VBDZGW/CA; Package: LED-5mm-RGB; EDM-PN: *; SAAB PN: *
footprint LED-5mm-RGB (LED 5mm 5.9x5.5mm)
pins: 1 R, 2 A, 3 B, 4 G

## LED-RGB-5mm-WP154A4SEJ3VBDZGW/CA-No_Part
designator LD?, comment value RGB  (hidden comment: WP154A4SEJ3VBDZGW/CA)  (mechanical)
LED RGB 5mm Common Anode; Manufacturer: Kingbright; Part Number: WP154A4SEJ3VBDZGW/CA; Package: NA; EDM-PN: *; SAAB PN: *
text: R; 1; 2; A; B; 3; G; 4

## LED-RGB-5mm-WP154A4SUREQBFZGC
designator LD?, comment value RGB  (hidden comment: WP154A4SUREQBFZGC)
LED RGB 5mm Common Cathode; Manufacturer: Kingbright; Part Number: WP154A4SUREQBFZGC; Package: LED-5mm-RGB; EDM-PN: *; SAAB PN: *
footprint LED-5mm-RGB (LED 5mm 5.9x5.5mm)
pins: 1 R, 2 C, 3 B, 4 G

## LED-Spacer-3x22-1
designator SP?  value Spacer-1  (hidden comment: LED-Spacer-3x22-1)
Led Spacer; Manufacturer: Owner; Part Number: Spacer IMC3 V2 x 1; Package: LED-Spacer-3mmx22mm; EDM-PN: *; SAAB PN: *
footprint LED-Spacer-3mmx22mm

## LED-Spacer-3x22-5
designator SP?  value Spacer-5  (hidden comment: LED-Spacer-3x22-5)
Led Spacer; Manufacturer: Owner; Part Number: Spacer IMC3 V2 x 5; Package: LED-Spacer-3mmx22mm-x5; EDM-PN: *; SAAB PN: *
footprint LED-Spacer-3mmx22mm-x5 (LED-Spacer-3mmx22mm x5)

## LED-White-3mm
designator LD?  value White  Text1: 3mm  (hidden comment: LED-White-3mm)
LED White 3mm; Manufacturer: Various; Part Number: LED White 3mm; Package: LED-3mm-White; EDM-PN: *; SAAB PN: *
footprint LED-3mm-White (LED 3mm 4.0x4.0mm White)
pins: 1 K, 2 A

## LED-White-3mm-Diffused
designator LD?  value White-DF  Text1: 3mm  (hidden comment: LED-White-3mm-Diffused)
LED White 3mm - Diffused; Manufacturer: Various; Part Number: LED White 3mm - Diffused; Package: LED-3mm-White; EDM-PN: *; SAAB PN: *
footprint LED-3mm-White (LED 3mm 4.0x4.0mm White)
pins: 1 K, 2 A

## LED-White-3mm-Rt
designator LD?  value White  Text1: 3mm  (hidden comment: LED-White-3mm-Rt)
LED White 3mm Rt Angle; Manufacturer: Various; Part Number: LED White 3mm; Package: LED-3mm-White-Rt; EDM-PN: *; SAAB PN: *
footprint LED-3mm-White-Rt (LED 3mm R Angle 4.0x4.0mm White)
pins: 1 K, 2 A

## LED-White-5mm
designator LD?  value White  Text1: 5mm  (hidden comment: LED-White-5mm)
LED White 5mm; Manufacturer: Various; Part Number: LED White 5mm; Package: LED-5mm-White; EDM-PN: *; SAAB PN: *
footprint LED-5mm-White (LED 5mm 5.9x5.5mm)
pins: 1 K, 2 A

## LED-White-5mm-C512A-WNN-CZ0B0152
designator LD?, comment value White  Text1: 5mm  (hidden comment: C512A-WNN-CZ0B0152)
LED Cool White 5mm 15850mcd; Manufacturer: Cree; Part Number: C512A-WNN-CZ0B0152; Package: LED-5mm-White; EDM-PN: *; SAAB PN: *
footprint LED-5mm-White (LED 5mm 5.9x5.5mm)
pins: 1 K, 2 A

## LED-White-5mm-C512A-WNN-CZ0B0152-LB
designator LD?, comment value White  Text1: 5mm  (hidden comment: C512A-WNN-CZ0B0152)
LED Cool White 5mm 15850mcd; Manufacturer: Cree; Part Number: C512A-WNN-CZ0B0152; Package: LED-5mm-White; EDM-PN: *; SAAB PN: *
footprint LED-5mm-White-LB (LED 5mm 5.9x5.5mm Loop-Back)
pins: 1 K, 2 A

## LED-White-5mm-HB
designator LD?  value White-HB  Text1: 5mm  (hidden comment: LED-White-5mm-HB)
LED White 5mm High-Bright; Manufacturer: Various; Part Number: LED White 5mm  High-Bright; Package: LED-5mm-White; EDM-PN: *; SAAB PN: *
footprint LED-5mm-White (LED 5mm 5.9x5.5mm)
pins: 1 K, 2 A

## LED-Yellow-3mm
designator LD?  value Yellow  Text1: 3mm  (hidden comment: LED-Yellow-3mm)
LED Yellow 3mm; Manufacturer: Various; EDM-PN: LED13; Reutech PN: 5961-LE-0049; Part Number: LED Yellow 3mm; Package: LED-3mm-Yellow; SAAB PN: *
footprint LED-3mm-Yellow (LED 3mm 4.0x4.0mm Yellow)
pins: 1 K, 2 A

## LED-Yellow-3mm-Diffused
designator LD?  value Yellow-DF  Text1: 3mm  (hidden comment: LED-Yellow-3mm-Diffused)
LED Yellow 3mm - Diffused; Manufacturer: Various; Part Number: LED Yellow 3mm - Diffused; Package: LED-3mm-Yellow; EDM-PN: *; SAAB PN: *
footprint LED-3mm-Yellow (LED 3mm 4.0x4.0mm Yellow)
pins: 1 K, 2 A

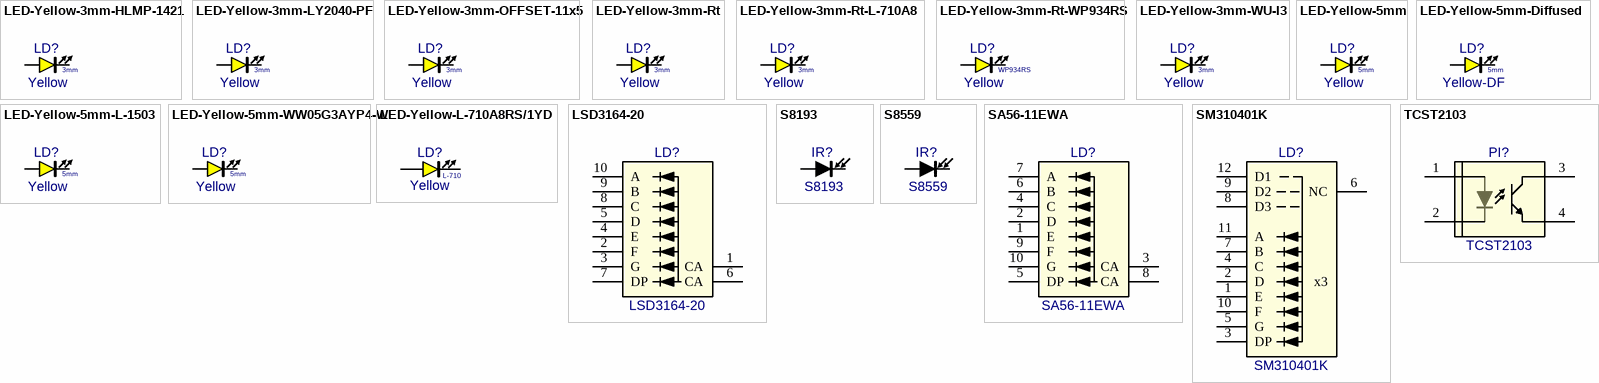
[diagram p5: symbols LED-Yellow-3mm-HLMP-1421 to TCST2103]

## LED-Yellow-3mm-HLMP-1421
designator LD?, comment value Yellow  Text1: 3mm  (hidden comment: HLMP-1421)
LED Yellow 3mm 10mA; Manufacturer: Broadcom; Part Number: HLMP-1421; Package: LED-3mm-Yellow; EDM-PN: *; Reutech PN: *; SAAB PN: *
footprint LED-3mm-Yellow (LED 3mm 4.0x4.0mm Yellow)
pins: 1 K, 2 A

## LED-Yellow-3mm-LY2040-PF
designator LD?, comment value Yellow  Text1: 3mm  (hidden comment: LY2040-PF)
LED Yellow 3mm; Manufacturer: Ligitek; EDM-PN: LED165; SAAB PN: 1AYC00136AEA; Part Number: LY2040-PF; Package: LED-3mm-Yellow; Reutech PN: *
footprint LED-3mm-Yellow (LED 3mm 4.0x4.0mm Yellow)
pins: 1 K, 2 A

## LED-Yellow-3mm-OFFSET-11x5
designator LD?, comment value Yellow  Text1: 3mm  (hidden comment: LED-Yellow-3mm)
LED Yellow 3mm; Manufacturer: Various; Reutech PN: 5961-LE-0049; Part Number: LED Yellow 3mm; Package: LED-3mm-Yellow-5MM-OFFSET; EDM-PN: *; SAAB PN: *
footprint LED-3mm-YELLOW-5MM-OFFSET (LED 3mm 4.0x4.0mm YELLOW)
pins: 1 K, 2 A

## LED-Yellow-3mm-Rt
designator LD?  value Yellow  Text1: 3mm  (hidden comment: LED-Yellow-3mm-Rt)
LED Yellow 3mm Rt Angle; Manufacturer: Various; EDM-PN: LED13; Reutech PN: 5961-LE-0049; Part Number: LED Yellow 3mm; Package: LED-3mm-Yellow-Rt; SAAB PN: *
footprint LED-3mm-Yellow-Rt (LED 3mm R Angle 4.0x4.0mm Yellow)
pins: 1 K, 2 A

## LED-Yellow-3mm-Rt-L-710A8
designator LD?  value Yellow  Text1: 3mm  (hidden comment: LED-Yellow-3mm-Rt-L-710A8)
LED Yellow 3mm Rt Angle; Manufacturer: Kingbright; Part Number: L-710A8RS/1YD; Package: LED-3mm-L-710-Yellow; EDM-PN: *; SAAB PN: *
footprint LED-3mm-L-710-Yellow (LED-3mm-L-710-Yellow 6.35x4.32mm)
pins: 1 K, 2 A

## LED-Yellow-3mm-Rt-WP934RS
designator LD?  value Yellow  Text1: WP934RS  (hidden comment: LED-Yellow-3mm-Rt-WP934RS)
LED Yellow 3mm Rt Angle; Manufacturer: Kingbright; Part Number: WP934RS/YD; Package: LED-3mm-WP934RS-Yellow; EDM-PN: *; SAAB PN: *
footprint LED-3mm-L-934RS-Yellow (LED-3mm-L-934RS-Yellow 4.6x4.6mm)
pins: 1 K, 2 A

## LED-Yellow-3mm-WU-I3
designator LD?  value Yellow  Text1: 3mm  (hidden comment: LED-Yellow-3mm-WU-I3)
LED Yellow 3mm and WU-I3 Holder; Manufacturer: Various/Commuica; Part Number: LED Yellow 3mm/WU-I3; Package: LED-3mm-Yellow-WU-I3; EDM-PN: *; SAAB PN: *
footprint LED-3mm-Yellow-WU-I3 (LED 3mm WU-I3 8.0x8.0mm Yellow)
pins: 1 K, 2 A

## LED-Yellow-5mm
designator LD?  value Yellow  Text1: 5mm  (hidden comment: LED-Yellow-5mm)
LED Yellow 5mm; Manufacturer: Various; Part Number: LED Yellow 5mm; Package: LED-5mm-Yellow; EDM-PN: *; SAAB PN: *
footprint LED-5mm-Yellow (LED 5mm 5.9x5.5mm)
pins: 1 K, 2 A

## LED-Yellow-5mm-Diffused
designator LD?  value Yellow-DF  Text1: 5mm  (hidden comment: LED-Yellow-5mm-Diffused)
LED Yellow 5mm - Diffused; Manufacturer: Various; Part Number: LED Yellow 5mm - Diffused; Package: LED-5mm-Yellow; EDM-PN: *; SAAB PN: *
footprint LED-5mm-Yellow (LED 5mm 5.9x5.5mm)
pins: 1 K, 2 A

## LED-Yellow-5mm-L-1503
designator LD?, comment value Yellow  Text1: 5mm  (hidden comment: LED-Yellow-5mm-L1503)
LED Yellow 5mm Rt Angle; Manufacturer: Kingbright; Part Number: L-1503CB/1YD; Package: LED-5MM-YELLOW-RT-9.2x6; EDM-PN: *; SAAB PN: *
footprint LED-5MM-YELLOW-RT-9.2x6 (LED-5mm RT 9.2x6.0mm Yellow)
pins: 1 K, 2 A

## LED-Yellow-5mm-WW05G3AYP4-W
designator LD?, comment value Yellow  Text1: 5mm  (hidden comment: WW05G3AYP4-W)
LED Yellow 5mm 4.7mm High; Manufacturer: WAH WANG Holdings/Rabtron; EDM-PN: LED188; Part Number: WW05G3AYP4-W; Package: LED-5x4.7mm-Yellow; SAAB PN: *
footprint LED-5x4.7mm-YELLOW (LED 5mm 5.9x5.5mm 4.7mm Yellow)
pins: 1 K, 2 A

## LED-Yellow-L-710A8RS/1YD
designator LD?, comment value Yellow  Text1: L-710  (hidden comment: LED-L-710A8RS/1YD)
LED Yellow 3mm Rt Angle; Manufacturer: Kingbright; Package: LED-3mm-L-710-Yellow; EDM-PN: *; SAAB PN: *; Part Number: L-710A8RS/1YD
footprint LED-3mm-L-710-Yellow (LED-3mm-L-710-Yellow 6.35x4.32mm)
pins: 1 K, 2 Y

## LSD3164-20
designator LD?
LED 7-Segment 1" AlGaAs Red; Manufacturer: Ligitek; Part Number: LSD3164-20; Package: LSD3164-20; EDM-PN: *; SAAB PN: *; Value: LSD3164-20
footprint LSD3164-20 (LSD3164-20 7.5x14.0mm)
pins: 1 CA, 2 F, 3 G, 4 E, 5 D, 6 CA, 7 DP, 8 C, 9 B, 10 A

## S8193
designator IR?
Si Photodiode X-Ray Detector; Manufacturer: Hamamatsu; Part Number: S8193; Package: S8193; EDM-PN: *; Text1: *; SAAB PN: *; Value: S8193
footprint S8193 (S8193 10.1x8.9mm)
pins: 1 A, 2 K

## S8559
designator IR?
Si Photodiode X-Ray Detector; Manufacturer: Hamamatsu; Part Number: S8559; Package: S8559; EDM-PN: *; Text1: *; SAAB PN: *; Value: S8559
footprint S8559 (S8559 10.1x8.9mm)
pins: 1 A, 2 K

## SA56-11EWA
designator LD?
LED 7-Segment 56" Gray/White; Manufacturer: Kingbright; Part Number: SA56-11EWA; Package: SA56-11EWA; EDM-PN: *; SAAB PN: *; Value: SA56-11EWA
footprint SA56-11EWA (SA56-11EWA 12.7x19.05mm)
pins: 1 E, 2 D, 3 CA, 4 C, 5 DP, 6 B, 7 A, 8 CA, 9 F, 10 G

## SM310401K
designator LD?
LED 7-Segment 4" Red; Manufacturer: Hiliseen; Part Number: SM310401K; Package: SM310401K-Red; EDM-PN: *; SAAB PN: *; Value: SM310401K
footprint SM310401K-Red (SM310401K-Red 31x16mm)
pins: 1 E, 2 D, 3 DP, 4 C, 5 G, 6 NC, 7 B, 8 D3, 9 D2, 10 F, 11 A, 12 D1
text: x3

## TCST2103
designator PI?
Optical Sensor Vertical Slotted; Manufacturer: Vishay; Part Number: TCST2103; Package: TCST2103; EDM-PN: *; SAAB PN: *; Value: TCST2103
footprint TCST2103 (TCST2103 24.5x6.0mm)
pins: 1 E+, 2 E, 3 D+, 4 D